# Altium schematic symbol library Altium_Lib.SchLib: 403 symbols (part 1 of 4) (continued)
## CONN_4_POS__S4B-ZR-SM4A-TF(LF)(SN) (continued)
CONN HEADER SMD R/A 4POS 1.5MM; Manufacturer: JST Sales America Inc.; Number of Positions: 4; Manufacturer Part Number: S4B-ZR-SM4A-TF(LF)(SN); Connector Type: Header; Mounting Type: All; Number of Rows: 1
footprint CONN_4_POS__S4B-ZR-SM4A-TF(LF)(SN)
pins: 1 (io), 2 (io), 3 (io), 4 (io)

## CONN_5_POS__22-05-7055
designator J?, comment 22-05-7055
CONN HEADER 5POS 2.5MM R/A TIN; Manufacturer: Molex Connector Corporation; Contact Length - Mating: 0.138" (3.50mm); Number of Positions: 5; Number of Positions Loaded: All; Pitch - Mating: 0.098" (2.50mm); Shrouding: Shrouded - 4 Wall; Category: Connectors, Interconnects; Connector Type: Header; Contact Finish - Mating: Tin; Contact Finish Thickness - Mating: 160µin (4.06µm); Contact Type: Male Pin; Fastening Type: Detent Lock; Features: -; Ingress Protection: -; Insulation Color: Natural; Manufacturer Part Number: 22-05-7055; Mounting Type: Through Hole, Right Angle; Number of Rows: 1; Packaging: Bulk; Part Status: Active; RoHS: RoHS Compliant; Row Spacing - Mating: -; Supplier: Digi-Key; Termination: Solder; ComponentLink1URL: http://www.molex.com/pdm_docs/sd/022057055_sd.pdf; ComponentLink1Description: http://www.molex.com/pdm_docs/sd/022057055_sd.pdf; Pricing: 1=0.81, 10=0.711, 50=0.6418, 100=0.6138, 250=0.558, 500=0.5022, 1000=0.4464, 2500=0.40455, 5000=0.3906 (USD); Supplier Part Number: WM18903-ND
footprint CONN_5_POS__22-05-7055 (2.50mm Wafer connector (molex))
pins: 1 (io), 2 (io), 3 (io), 4 (io), 5 (io)

## CONN_5_POS__0530470510
designator J?, comment 0530470510
CONN HEADER 5POS 1.25MM VERT TIN; Manufacturer: Molex, LLC; Number of Positions Loaded: All; Material Flammability Rating: UL94 V-0; Shrouding: Shrouded - 4 Wall; Style: Board to Cable/Wire; Number of Positions: 5; Pitch - Mating: 0.049" (1.25mm); Contact Length - Mating: 0.089" (2.25mm); Contact Length - Post: 0.091" (2.30mm); Current Rating: -; Manufacturer Part Number: 0530470510; Contact Finish Thickness - Post: -; Voltage Rating: -; Insulation Color: Natural; Insulation Material: Polyamide (PA66), Nylon 6/6; Category: Connectors, Interconnects; Supplier: Digi-Key; Ingress Protection: -; Number of Rows: 1; Contact Finish Thickness - Mating: 35.0µin (0.90µm); Termination: Solder; Contact Finish - Mating: Tin; Insulation Height: 0.165" (4.20mm); Contact Finish - Post: Tin; Contact Shape: Rectangular; Fastening Type: Detent Lock; Mated Stacking Heights: -; Packaging: Tray; Part Status: Active; Contact Material: Phosphor Bronze; RoHS: RoHS Compliant; Mounting Type: Through Hole; Connector Type: Header; Row Spacing - Mating: -; Features: -; Contact Type: Male Blade; Overall Contact Length: -; Operating Temperature: -; Applications: Automotive, General Purpose, Industrial, Medical; ComponentLink1URL: https://www.molex.com/pdm_docs/sd/530470510_sd.pdf; ComponentLink1Description: https://www.molex.com/pdm_docs/sd/530470510_sd.pdf; Pricing: 1=0.49, 10=0.463, 100=0.3551, 500=0.3088, 1000=0.25476, 5000=0.22388, 10000=0.20844 (USD); Supplier Part Number: WM1734-ND
footprint CONN_5_POS__0530470510
pins: 1 (io), 2 (io), 3 (io), 4 (io), 5 (io)

## CONN_5_POS__0530480510
designator J?, comment 0530480510
CONN HEADER 5POS 1.25MM R/A TIN; Manufacturer: Molex, LLC; Pitch - Mating: 0.049" (1.25mm); Shrouding: Shrouded - 4 Wall; Number of Positions: 5; Style: Board to Cable/Wire; Contact Length - Post: 0.091" (2.30mm); Number of Positions Loaded: All; Material Flammability Rating: UL94 V-0; Contact Material: Phosphor Bronze; Contact Length - Mating: -; Category: Connectors, Interconnects; Insulation Height: 0.138" (3.50mm); Fastening Type: Detent Lock; Part Status: Active; Packaging: Tray; Contact Shape: Rectangular; Contact Finish Thickness - Mating: -; Termination: Solder; Connector Type: Header; Mounting Type: Through Hole, Right Angle; Overall Contact Length: -; Contact Finish - Mating: Tin; Insulation Material: Polyamide (PA), Nylon; Features: -; Supplier: Digi-Key; Manufacturer Part Number: 0530480510; Contact Finish - Post: Tin; Number of Rows: 1; Row Spacing - Mating: -; Contact Type: Male Blade; RoHS: RoHS Compliant; Operating Temperature: -; Ingress Protection: -; Insulation Color: Natural; Current Rating: -; Voltage Rating: -; Mated Stacking Heights: -; Contact Finish Thickness - Post: -; Applications: Automotive, General Purpose, Industrial, Medical; ComponentLink1URL: http://www.molex.com/pdm_docs/sd/530480510_sd.pdf; ComponentLink1Description: http://www.molex.com/pdm_docs/sd/530480510_sd.pdf; Pricing: 1=0.55, 10=0.518, 25=0.4664, 50=0.4144, 100=0.3972, 250=0.36268, 500=0.3454, 1000=0.28496, 2500=0.25905 (USD); Supplier Part Number: WM1745-ND
footprint CONN_5_POS__0530480510
pins: 1 (io), 2 (io), 3 (io), 4 (io), 5 (io)

## CONN_5_POS__0532610571
designator J?, comment 53261-0571
Headers & Wire Housings R/A SMT 5POS HEADER; Manufacturer: Molex; Current Rating: 1 A; Mounting Angle: Right Angle; Number of Positions: 5 Position; Voltage Rating: 125 V; Pitch: 1.25 mm; Supplier 1: Mouser; Manufacturer Part Number: 53261-0571; RoHS: RoHS Compliant; Category: Headers & Wire Housings; Stock 1: 15425; Pricing 1: 1=0.780, 10=0.685, 100=0.596, 500=0.487, 1000=0.433, 2000=0.392, 5000=0.379, 10000=0.360, 25000=0.352 (USD); Accessory Type: -; Contact Plating: Tin; Contact Type: -; Housing Material: Thermoplastic; Number of Rows: 1 Row; Packaging: Cut Tape; Product: Headers; Series: 53261; Termination Style: SMD/SMT; Type: Shrouded; Brand: Molex; Contact Material: Tin; Flammability Rating: UL 94 V-0; Mounting Style: SMD; Row Spacing: -; Contact Gender: Pin (Male); Maximum Operating Temperature: + 85 C; Minimum Operating Temperature: - 40 C; Standard Pack Qty: 1000; Tradename: PicoBlade; RoHS - Mouser: Y; Minimum Order Quantity: 1; Reeling: True; ComponentLink1URL: https://www.mouser.com/datasheet/2/276/0532610571_PCB_HEADERS-170968.pdf; ComponentLink1Description: https://www.mouser.com/datasheet/2/276/0532610571_PCB_HEADERS-170968.pdf; Supplier Part Number 1: 538-53261-0571
footprint CONN_5_POS__0532610571
pins: 1 (io), 2 (io), 3 (io), 4 (io), 5 (io)

## CONN_5_POS__0533980571
designator J?, comment 53398-0571
CONN HEADER SMD 5POS 1.25MM; Manufacturer: Molex; Current Rating: 1 A; Mounting Angle: Vertical; Number of Positions: 5 Position; Voltage Rating: 125 V; Supplier 1: Mouser; Manufacturer Part Number: 53398-0571; RoHS: RoHS Compliant; Category: Headers & Wire Housings; Stock 1: 51775; Pricing 1: 1=1.32, 10=1.15, 100=0.999, 500=0.818, 1000=0.389, 2000=0.342, 10000=0.334, 25000=0.326 (USD); Accessory Type: -; Contact Plating: Tin; Contact Type: -; Housing Material: Nylon; Number of Rows: 1 Row; Packaging: Cut Tape; Product: Headers; Series: 53398; Termination Style: SMD/SMT; Type: Shrouded; Brand: Molex; Contact Material: Tin; Flammability Rating: UL 94 V-0; Mounting Style: SMD/SMT; Pitch: 1.25 mm; Row Spacing: -; Contact Gender: Pin (Male); Housing Color: Natural; Maximum Operating Temperature: + 105 C; Minimum Operating Temperature: - 40 C; Product Type: Headers & Wire Housings; Standard Pack Qty: 1000; Subcategory: Headers & Wire Housings; Tradename: PicoBlade; RoHS - Mouser: Y; Minimum Order Quantity: 1; Reeling: True; ComponentLink1URL: https://www.mouser.com/datasheet/2/276/0533980571_PCB_HEADERS-146486.pdf; ComponentLink1Description: https://www.mouser.com/datasheet/2/276/0533980571_PCB_HEADERS-146486.pdf; Supplier Part Number 1: 538-53398-0571
footprint CONN_5_POS__0533980571
pins: 1 (io), 2 (io), 3 (io), 4 (io), 5 (io)

## CONN_5_POS__0705530004
designator J?, comment 0705530004
CONN HEADER 5POS .100 R/A GOLD; Manufacturer: Molex, LLC; Material Flammability Rating: UL94 V-0; Pitch - Mating: 0.100" (2.54mm); Style: Board to Cable/Wire; Shrouding: Shrouded - 4 Wall; Contact Length - Post: 0.130" (3.30mm); Contact Length - Mating: 0.240" (6.10mm); Number of Positions: 5; Number of Positions Loaded: All; Voltage Rating: 250V; Connector Type: Header; Contact Material: Phosphor Bronze; Contact Finish - Post: Tin; Category: Connectors, Interconnects; Insulation Material: Polyester, Glass Filled; Ingress Protection: -; Insulation Height: 0.215" (5.45mm); Operating Temperature: -40°C ~ 105°C; Termination: Solder; Contact Finish Thickness - Mating: 15µin (0.38µm); Part Status: Active; Supplier: Digi-Key; Fastening Type: Latch Holder; Number of Rows: 1; Packaging: Tube; Contact Shape: Square; Manufacturer Part Number: 0705530004; Mounting Type: Through Hole, Right Angle; Overall Contact Length: -; Contact Type: Male Pin; Features: -; Contact Finish - Mating: Gold; Row Spacing - Mating: -; RoHS: RoHS Compliant; Contact Finish Thickness - Post: 74.8µin (1.90µm); Mated Stacking Heights: -; Applications: Automotive, General Purpose, Industrial, Medical; Insulation Color: Black; Current Rating: -; ComponentLink1URL: http://www.molex.com/pdm_docs/sd/705530002_sd.pdf; ComponentLink1Description: http://www.molex.com/pdm_docs/sd/705530002_sd.pdf; Pricing: 1=1.45, 10=1.32, 50=1.1854, 100=1.1315, 250=1.02372, 500=0.9429, 1000=0.8082, 2500=0.75432, 5000=0.7166 (USD); Supplier Part Number: WM4903-ND
footprint CONN_5_POS__705530004
pins: 1 (io), 2 (io), 3 (io), 4 (io), 5 (io)

## CONN_5_POS__5015680507
designator J?, comment 501568-0507
CONN HEADER SMD R/A 5POS 1MM; Manufacturer: Molex; Current Rating: 1 A; Mounting Angle: Right Angle; Number of Positions: 5 Position; Voltage Rating: 50 VAC/DC; Supplier 1: Mouser; Manufacturer Part Number: 501568-0507; RoHS: RoHS Compliant; Category: Headers & Wire Housings; Stock 1: 4935; Pricing 1: 1=0.670, 10=0.603, 100=0.475, 500=0.425, 1000=0.385, 1700=0.274, 8500=0.262, 23800=0.259 (USD); Accessory Type: -; Contact Plating: Tin; Contact Type: -; Housing Material: Nylon; Number of Rows: 1 Row; Packaging: Cut Tape; Product: Headers; Series: 501568; Termination Style: SMD/SMT; Type: Shrouded; Brand: Molex; Contact Material: Tin; Mounting Style: SMD/SMT; Pitch: 1 mm; Row Spacing: -; Contact Gender: Pin (Male); Maximum Operating Temperature: + 105 C; Minimum Operating Temperature: - 40 C; Product Type: Headers & Wire Housings; Standard Pack Qty: 1700; Subcategory: Headers & Wire Housings; Tradename: Pico-Clasp; RoHS - Mouser: Y; Minimum Order Quantity: 1; Reeling: True; ComponentLink1URL: https://www.mouser.com/datasheet/2/276/5015680507_PCB_HEADERS-179165.pdf; ComponentLink1Description: https://www.mouser.com/datasheet/2/276/5015680507_PCB_HEADERS-179165.pdf; Supplier Part Number 1: 538-501568-0507
footprint CONN_5_POS__5015680507
pins: 1 (io), 2 (io), 3 (io), 4 (io), 5 (io)

## CONN_5_POS__PAD
designator J?  (value not drawn)  (no BOM)
CONN HEADER 5POS PAD; Number of Positions Loaded: All; Number of Positions: 5; Manufacturer Part Number: *; Number of Rows: 1; Manufacturer: *
footprint CONN_5_POS__PAD
pins: 1 (io), 2 (io), 3 (io), 4 (io), 5 (io)

## CONN_6_POS__43045-0601
designator J?, comment 0430450601
CONN HEADER R/A DUAL GOLD 6CKT; Manufacturer: Molex, LLC; Number of Positions: 6; Number of Positions Loaded: All; Pitch - Mating: 0.118" (3.00mm); Shrouding: Shrouded - 4 Wall; Category: Connectors, Interconnects; Connector Type: Header; Contact Finish - Mating: Gold; Contact Finish Thickness - Mating: 15µin (0.38µm); Contact Length - Mating: -; Contact Type: Male Pin; Fastening Type: Locking Ramp; Features: Board Lock; Ingress Protection: -; Insulation Color: Black; Manufacturer Part Number: 0430450601; Mounting Type: Through Hole, Right Angle; Number of Rows: 2; Packaging: Tray; Part Status: Active; RoHS: RoHS Compliant; Row Spacing - Mating: 0.118" (3.00mm); Supplier: Digi-Key; Termination: Solder; ComponentLink1URL: http://www.molex.com/pdm_docs/sd/430450601_sd.pdf; ComponentLink1Description: http://www.molex.com/pdm_docs/sd/430450601_sd.pdf; Pricing: 1=2.14, 10=1.943, 50=1.7444, 100=1.6651, 250=1.50652, 500=1.38758, 1000=1.18935, 2500=1.11006, 5000=1.05456 (USD); Supplier Part Number: WM4037-ND
footprint CONN_6_POS__20430450601
pins: 1 (io), 2 (io), 3 (io), 4 (io), 5 (io), 6 (io)

## CONN_6_POS__0430450612
designator J?, comment 0430450612
CONN HEADER 6POS 3MM VERT TIN; Manufacturer: Molex, LLC; Pitch - Mating: 0.118" (3.00mm); Shrouding: Shrouded - 4 Wall; Number of Positions: 6; Style: Board to Cable/Wire; Number of Positions Loaded: All; Contact Length - Post: 0.125" (3.18mm); Material Flammability Rating: UL94 V-0; Ingress Protection: -; Connector Type: Header; Contact Finish - Mating: Tin; RoHS: RoHS Compliant; Contact Length - Mating: -; Part Status: Active; Current Rating: -; Contact Finish - Post: Tin; Contact Material: Brass; Row Spacing - Mating: 0.118" (3.00mm); Packaging: Tray; Operating Temperature: -; Overall Contact Length: -; Insulation Material: Liquid Crystal Polymer (LCP), Glass Filled; Termination: Kinked Pin, Solder; Features: Board Guide; Contact Shape: Square; Number of Rows: 2; Contact Finish Thickness - Mating: 100µin (2.54µm); Contact Type: Male Pin; Voltage Rating: -; Applications: General Purpose, Medical, Military, Telecommunications; Contact Finish Thickness - Post: -; Insulation Color: Black; Mated Stacking Heights: -; Fastening Type: Locking Ramp; Insulation Height: 0.390" (9.91mm); Manufacturer Part Number: 0430450612; Mounting Type: Through Hole; Category: Connectors, Interconnects; Supplier: Digi-Key; ComponentLink1URL: http://www.molex.com/pdm_docs/sd/430450612_sd.pdf; ComponentLink1Description: http://www.molex.com/pdm_docs/sd/430450612_sd.pdf; Pricing: 1=1.36, 10=1.232, 50=1.106, 100=1.0557, 250=0.95512, 500=0.87972, 1000=0.75405, 2500=0.70378, 5000=0.66859 (USD); Supplier Part Number: WM1791-ND
footprint CONN_6_POS__0430450612
pins: 1 (io), 2 (io), 3 (io), 4 (io), 5 (io), 6 (io)

## CONN_6_POS__0530470610
designator J?, comment 0530470610
CONN HEADER 6POS 1.25MM VERT TIN; Manufacturer: Molex, LLC; Pitch - Mating: 0.049" (1.25mm); Shrouding: Shrouded - 4 Wall; Material Flammability Rating: UL94 V-0; Contact Length - Post: 0.091" (2.30mm); Number of Positions: 6; Style: Board to Cable/Wire; Number of Positions Loaded: All; Contact Length - Mating: 0.089" (2.25mm); Manufacturer Part Number: 0530470610; Category: Connectors, Interconnects; Supplier: Digi-Key; RoHS: RoHS Compliant; Contact Finish - Mating: Tin; Mated Stacking Heights: -; Applications: Automotive, General Purpose, Industrial, Medical; Contact Shape: Rectangular; Insulation Height: 0.165" (4.20mm); Mounting Type: Through Hole; Contact Material: Phosphor Bronze; Ingress Protection: -; Current Rating: -; Features: -; Contact Type: Male Blade; Operating Temperature: -; Connector Type: Header; Part Status: Active; Packaging: Tray; Overall Contact Length: -; Row Spacing - Mating: -; Number of Rows: 1; Contact Finish - Post: Tin; Contact Finish Thickness - Mating: 35.4µin (0.90µm); Insulation Material: Polyamide (PA66), Nylon 6/6; Voltage Rating: -; Contact Finish Thickness - Post: -; Insulation Color: Natural; Fastening Type: Detent Lock; Termination: Solder; ComponentLink1URL: https://www.molex.com/pdm_docs/sd/530470610_sd.pdf; ComponentLink1Description: https://www.molex.com/pdm_docs/sd/530470610_sd.pdf; Pricing: 1=0.62, 10=0.585, 100=0.4487, 500=0.3902, 1000=0.32192, 5000=0.2829, 10000=0.26339 (USD); Supplier Part Number: WM1735-ND
footprint CONN_6_POS__0530470610
pins: 1 (io), 2 (io), 3 (io), 4 (io), 5 (io), 6 (io)

## CONN_6_POS__0530480610
designator J?, comment 0530480610
CONN HEADER 6POS 1.25MM R/A TIN; Manufacturer: Molex, LLC; Number of Positions Loaded: All; Pitch - Mating: 0.049" (1.25mm); Number of Positions: 6; Style: Board to Cable/Wire; Shrouding: Shrouded - 4 Wall; Material Flammability Rating: UL94 V-0; Contact Length - Post: 0.091" (2.30mm); Supplier: Digi-Key; Category: Connectors, Interconnects; Mounting Type: Through Hole, Right Angle; Number of Rows: 1; Packaging: Tray; RoHS: RoHS Compliant; Part Status: Active; Manufacturer Part Number: 0530480610; Connector Type: Header; Contact Type: Male Blade; Row Spacing - Mating: -; Current Rating: -; Insulation Color: Natural; Contact Finish - Post: Tin; Contact Length - Mating: -; Contact Finish - Mating: Tin; Voltage Rating: -; Contact Finish Thickness - Post: -; Mated Stacking Heights: -; Fastening Type: Detent Lock; Operating Temperature: -; Contact Finish Thickness - Mating: -; Overall Contact Length: -; Insulation Material: Polyamide (PA), Nylon; Contact Material: Phosphor Bronze; Applications: Automotive, General Purpose, Industrial, Medical; Ingress Protection: -; Insulation Height: 0.138" (3.50mm); Termination: Solder; Features: -; Contact Shape: Rectangular; ComponentLink1URL: http://www.molex.com/pdm_docs/sd/530480610_sd.pdf; ComponentLink1Description: http://www.molex.com/pdm_docs/sd/530480610_sd.pdf; Pricing: 1=0.79, 10=0.744, 25=0.6692, 50=0.595, 100=0.5702, 250=0.5206, 500=0.4958, 1000=0.40904, 2500=0.37185 (USD); Supplier Part Number: WM1746-ND
footprint CONN_6_POS__0530480610
pins: 1 (io), 2 (io), 3 (io), 4 (io), 5 (io), 6 (io)

## CONN_6_POS__0559350630
designator J?, comment 55935-0630
Headers & Wire Housings 2.0 WtB Plg Hsg Assy Plg Hsg Assy RA 6Ckt; Manufacturer: Molex; Current Rating: 3 A; Mounting Angle: Right Angle; Pitch: 2 mm; Number of Positions: 6 Position; Voltage Rating: 250 V; RoHS: RoHS Compliant; Product: Headers; Manufacturer Part Number: 55935-0630; Series: 55935; Number of Rows: 1 Row; Contact Type: -; Category: Headers & Wire Housings; Accessory Type: -; Packaging: Tray; Contact Plating: Tin; Supplier: Mouser; Minimum Operating Temperature: - 25 C; Housing Material: Polyester; Product Type: Headers & Wire Housings; Mounting Style: Through Hole; Maximum Operating Temperature: + 85 C; Type: Shrouded; Contact Gender: Pin (Male); RoHS - Mouser: Y; Minimum Order Quantity: 1; Subcategory: Headers & Wire Housings; Contact Material: Tin; Reeling: False; Tradename: MicroClasp; Standard Pack Qty: 200; Housing Gender: -; Row Spacing: -; Brand: Molex; Termination Style: Through Hole; ComponentLink1URL: https://www.mouser.com/datasheet/2/276/0559350630_PCB_HEADERS-171317.pdf; ComponentLink1Description: https://www.mouser.com/datasheet/2/276/0559350630_PCB_HEADERS-171317.pdf; Pricing: 1=0.630, 10=0.543, 100=0.444, 500=0.357, 1000=0.295, 2500=0.268, 5000=0.259, 10000=0.241, 25000=0.232 (USD); Supplier Part Number: 538-55935-0630
footprint CONN_6_POS__0559350630
pins: 1 (io), 2 (io), 3 (io), 4 (io), 5 (io), 6 (io)

## CONN_6_POS__5015680607
designator J?, comment 501568-0607
Headers & Wire Housings 1.0 WtB 6Ckt R/AWaferAssyEmbsTpPk; Manufacturer: Molex; Current Rating: 1 A; Mounting Angle: Right Angle; Number of Positions: 6 Position; Voltage Rating: 50 VAC/DC; Pitch: 1 mm; Supplier 1: Mouser; Manufacturer Part Number: 501568-0607; RoHS: RoHS Compliant; Category: Headers & Wire Housings; Stock 1: 22880; Pricing 1: 1=0.770, 10=0.636, 100=0.557, 500=0.482, 1300=0.398, 2600=0.362, 3900=0.349, 9100=0.325, 24700=0.313 (USD); Accessory Type: -; Contact Plating: Tin; Contact Type: -; Housing Material: Nylon; Number of Rows: 1 Row; Packaging: Cut Tape; Product: Headers; Series: 501568; Termination Style: SMD/SMT; Type: Shrouded; Brand: Molex; Contact Material: Tin; Mounting Style: SMD; Row Spacing: -; Contact Gender: Pin (Male); Maximum Operating Temperature: + 105 C; Minimum Operating Temperature: - 40 C; Standard Pack Qty: 1300; Tradename: Pico-Clasp; RoHS - Mouser: Y; Minimum Order Quantity: 1; Reeling: True; ComponentLink1URL: https://www.mouser.com/datasheet/2/276/5015680607_PCB_HEADERS-155422.pdf; ComponentLink1Description: https://www.mouser.com/datasheet/2/276/5015680607_PCB_HEADERS-155422.pdf; Supplier Part Number 1: 538-501568-0607
footprint CONN_6_POS__5015680607
pins: 1 (io), 2 (io), 3 (io), 4 (io), 5 (io), 6 (io)

## CONN_6_POS__TBP02R1-381-06BE
designator J?, comment TBP02R1-381-06BE
TERMINAL BLOCK, PLUGGABLE, 3.81,; Manufacturer: CUI Devices; Product Status: New Product; Supplier 1: Mouser; Manufacturer Part Number: TBP02R1-381-06BE; RoHS: RoHS Compliant; Category: Pluggable Terminal Blocks; Stock 1: 0; Pricing 1: 1=0.00 (AUD); Minimum Order Quantity: 1; Reeling: False
footprint CONN_6_POS__TBP02R1-381-06BE (Connector; Header; 6 Position)
pins: 1 (io), 2 (io), 3 (io), 4 (io), 5 (io), 6 (io)

## CONN_7_POS__0530470710
designator J?, comment 0530470710
CONN HEADER 7POS 1.25MM VERT TIN; Manufacturer: Molex, LLC; Pitch - Mating: 0.049" (1.25mm); Number of Positions: 7; Number of Positions Loaded: All; Style: Board to Cable/Wire; Shrouding: Shrouded - 4 Wall; Contact Length - Mating: 0.089" (2.25mm); Contact Length - Post: 0.091" (2.30mm); Material Flammability Rating: UL94 V-0; Manufacturer Part Number: 0530470710; Category: Connectors, Interconnects; Supplier: Digi-Key; RoHS: RoHS Compliant; Packaging: Tray; Part Status: Active; Connector Type: Header; Contact Type: Male Blade; Number of Rows: 1; Row Spacing - Mating: -; Mounting Type: Through Hole; Termination: Solder; Fastening Type: Detent Lock; Overall Contact Length: -; Insulation Height: 0.165" (4.20mm); Contact Shape: Rectangular; Contact Finish - Mating: Tin; Contact Finish Thickness - Mating: 35µin (0.90µm); Contact Finish - Post: Tin; Contact Material: Phosphor Bronze; Insulation Material: Polyamide (PA66), Nylon 6/6; Features: -; Operating Temperature: -; Ingress Protection: -; Insulation Color: Natural; Current Rating: -; Voltage Rating: -; Mated Stacking Heights: -; Contact Finish Thickness - Post: -; Applications: Automotive, General Purpose, Industrial, Medical; ComponentLink1URL: http://www.molex.com/pdm_docs/sd/530470710_sd.pdf; ComponentLink1Description: http://www.molex.com/pdm_docs/sd/530470710_sd.pdf; Pricing: 1=0.67, 10=0.628, 100=0.4814, 500=0.4186, 1000=0.34535, 5000=0.30349, 10000=0.28256 (USD); Supplier Part Number: WM1736-ND
footprint CONN_7_POS__0530470710
pins: 1 (io), 2 (io), 3 (io), 4 (io), 5 (io), 6 (io), 7 (io)

## CONN_7_POS__0530480710
designator J?, comment 0530480710
CONN HEADER 7POS 1.25MM R/A TIN; Manufacturer: Molex, LLC; Pitch - Mating: 0.049" (1.25mm); Number of Positions: 7; Shrouding: Shrouded - 4 Wall; Style: Board to Cable/Wire; Number of Positions Loaded: All; Material Flammability Rating: UL94 V-0; Contact Length - Post: 0.091" (2.30mm); Supplier 1: Digi-Key; Category: Connectors, Interconnects; Supplier: Digi-Key; Packaging: Tray; Manufacturer Part Number: 0530480710; RoHS: RoHS Compliant; Part Status: Active; Contact Type: Male Blade; Connector Type: Header; Number of Rows: 1; Overall Contact Length: -; Insulation Color: Natural; Insulation Height: 0.138" (3.50mm); Features: -; Applications: Automotive, General Purpose, Industrial, Medical; Current Rating: -; Ingress Protection: -; Voltage Rating: -; Contact Finish Thickness - Mating: -; Row Spacing - Mating: -; Contact Finish - Mating: Tin; Fastening Type: Detent Lock; Insulation Material: Polyamide (PA), Nylon; Contact Finish Thickness - Post: -; Termination: Solder; Contact Shape: Rectangular; Operating Temperature: -; Mounting Type: Through Hole, Right Angle; Contact Length - Mating: -; Mated Stacking Heights: -; Contact Material: Phosphor Bronze; Contact Finish - Post: Tin; Supplier Part Number: WM1747-ND
footprint CONN_7_POS__0530480710
pins: 1 (io), 2 (io), 3 (io), 4 (io), 5 (io), 6 (io), 7 (io)

## CONN_7_POS__0532610771
designator J?, comment 53261-0771
CONN HEADER SMD R/A 7POS 1.25MM; Manufacturer: Molex; Current Rating: 1 A; Mounting Angle: Right Angle; Number of Positions: 7 Position; Voltage Rating: 125 V; Supplier 1: Mouser; Manufacturer Part Number: 53261-0771; RoHS: RoHS Compliant; Category: Headers & Wire Housings; Stock 1: 3729; Pricing 1: 1=1.25, 10=1.09, 100=0.940, 500=0.798, 1000=0.408, 2000=0.358, 10000=0.329, 25000=0.321 (USD); Accessory Type: -; Contact Plating: Tin; Contact Type: -; Housing Material: Thermoplastic; Number of Rows: 1 Row; Packaging: Cut Tape; Product: Headers; Series: 53261; Termination Style: SMD/SMT; Type: Shrouded; Brand: Molex; Contact Material: Tin; Flammability Rating: UL 94 V-0; Mounting Style: SMD/SMT; Pitch: 1.25 mm; Row Spacing: -; Contact Gender: Pin (Male); Housing Color: Natural; Maximum Operating Temperature: + 105 C; Minimum Operating Temperature: - 40 C; Product Type: Headers & Wire Housings; Standard Pack Qty: 1000; Subcategory: Headers & Wire Housings; Tradename: PicoBlade; RoHS - Mouser: Y; Minimum Order Quantity: 1; Reeling: True; ComponentLink1URL: https://www.mouser.com/datasheet/2/276/0532610771_PCB_HEADERS-170969.pdf; ComponentLink1Description: https://www.mouser.com/datasheet/2/276/0532610771_PCB_HEADERS-170969.pdf; Supplier Part Number 1: 538-53261-0771
footprint CONN_7_POS__0532610771
pins: 1 (io), 2 (io), 3 (io), 4 (io), 5 (io), 6 (io), 7 (io)

## CONN_7_POS__5015680707
designator J?, comment 501568-0707
CONN HEADER SMD R/A 7POS 1MM; Manufacturer: Molex; Current Rating: 1 A; Mounting Angle: Right Angle; Number of Positions: 7 Position; Voltage Rating: 50 VAC/DC; Supplier 1: Mouser; Manufacturer Part Number: 501568-0707; RoHS: RoHS Compliant; Category: Headers & Wire Housings; Stock 1: 2879; Pricing 1: 1=0.780, 10=0.639, 100=0.560, 500=0.484, 1300=0.400, 2600=0.363, 3900=0.351, 9100=0.327, 24700=0.315 (USD); Accessory Type: -; Contact Plating: Tin; Contact Type: -; Housing Material: Nylon; Number of Rows: 1 Row; Packaging: Cut Tape; Product: Headers; Series: 501568; Termination Style: SMD/SMT; Type: Shrouded; Brand: Molex; Contact Material: Tin; Mounting Style: SMD/SMT; Pitch: 1 mm; Row Spacing: -; Contact Gender: Pin (Male); Housing Color: Natural; Maximum Operating Temperature: + 105 C; Minimum Operating Temperature: - 40 C; Product Type: Headers & Wire Housings; Standard Pack Qty: 1300; Subcategory: Headers & Wire Housings; Tradename: Pico-Clasp; RoHS - Mouser: Y; Minimum Order Quantity: 1; Reeling: True; ComponentLink1URL: https://www.mouser.com/datasheet/2/276/5015680707_PCB_HEADERS-179190.pdf; ComponentLink1Description: https://www.mouser.com/datasheet/2/276/5015680707_PCB_HEADERS-179190.pdf; Supplier Part Number 1: 538-501568-0707
footprint CONN_7_POS__5015680707
pins: 1 (io), 2 (io), 3 (io), 4 (io), 5 (io), 6 (io), 7 (io)

## CONN_7_POS__PAD_(7X 1.25mmx3.5mm)
designator C?, comment CONN PAD 7 POS
CONN HEADER 7POS Solder pad; Manufacturer: *; Manufacturer Part Number: *; Mounting Type: SMT
footprint CONN_7_POS__PAD(7X 1.25mmx3.5mm)
pins: 1 (io), 2 (io), 3 (io), 4 (io), 5 (io), 6 (io), 7 (io)

## CONN_8_POS__0430450800
designator J?, comment 43045-0800
CONN HEADER R/A 8POS 3MM; Manufacturer: Molex; Current Rating: 8.5 A; Mounting Angle: Right Angle; Number of Positions: 8 Position; Voltage Rating: 600 V; Supplier 1: Mouser; Manufacturer Part Number: 43045-0800; RoHS: RoHS Compliant; Category: Headers & Wire Housings; Stock 1: 6379; Pricing 1: 1=1.90, 10=1.55, 100=1.34, 500=1.23, 1000=1.05, 2500=0.989, 5000=0.918, 10000=0.883 (USD); Accessory Type: -; Contact Plating: Tin; Contact Type: -; Housing Material: Thermoplastic; Number of Rows: 2 Row; Packaging: Tray; Product: Headers; Series: 43045; Termination Style: Through Hole; Type: Power; Brand: Molex; Contact Material: Tin; Flammability Rating: UL 94 V-0; Mounting Style: Board Lock; Pitch: 3 mm; Row Spacing: 3 mm; Contact Gender: Pin (Male); Housing Color: Black; Maximum Operating Temperature: + 105 C; Minimum Operating Temperature: - 40 C; Product Type: Headers & Wire Housings; Standard Pack Qty: 1440; Subcategory: Headers & Wire Housings; Tradename: Micro-Fit 3.0; RoHS - Mouser: Y; Minimum Order Quantity: 1; Reeling: False; ComponentLink1URL: https://www.mouser.com/datasheet/2/276/0430450800_PCB_HEADERS-142625.pdf; ComponentLink1Description: https://www.mouser.com/datasheet/2/276/0430450800_PCB_HEADERS-142625.pdf; Supplier Part Number 1: 538-43045-0800
footprint CONN_8_POS__0430450800
pins: 1 (io), 2 (io), 3 (io), 4 (io), 5 (io), 6 (io), 7 (io), 8 (io)

## CONN_8_POS__0430450812
designator J?, comment 0430450812
CONN HEADER 8POS 3MM VERT TIN; Manufacturer: Molex, LLC; Material Flammability Rating: UL94 V-0; Contact Length - Post: 0.125" (3.18mm); Shrouding: Shrouded - 4 Wall; Style: Board to Cable/Wire; Number of Positions Loaded: All; Number of Positions: 8; Pitch - Mating: 0.118" (3.00mm); Current Rating: -; Insulation Height: 0.390" (9.91mm); Voltage Rating: -; Contact Length - Mating: -; Features: Board Guide; Contact Finish - Post: Tin; Fastening Type: Locking Ramp; Contact Finish - Mating: Tin; Insulation Material: Liquid Crystal Polymer (LCP), Glass Filled; Contact Material: Brass; Overall Contact Length: -; Contact Shape: Square; Ingress Protection: -; Termination: Kinked Pin, Solder; Contact Finish Thickness - Mating: 100µin (2.54µm); Operating Temperature: -; Mated Stacking Heights: -; Insulation Color: Black; Contact Finish Thickness - Post: -; Applications: General Purpose, Medical, Military, Telecommunications; Contact Type: Male Pin; Manufacturer Part Number: 0430450812; Part Status: Active; Category: Connectors, Interconnects; Packaging: Tray; Supplier: Digi-Key; RoHS: RoHS Compliant; Mounting Type: Through Hole; Connector Type: Header; Number of Rows: 2; Row Spacing - Mating: 0.118" (3.00mm); ComponentLink1URL: http://www.molex.com/pdm_docs/sd/430450812_sd.pdf; ComponentLink1Description: http://www.molex.com/pdm_docs/sd/430450812_sd.pdf; Pricing: 1=1.73, 10=1.566, 50=1.4064, 100=1.3425, 250=1.21468, 500=1.11878, 1000=0.95895, 2500=0.89502, 5000=0.85027 (USD); Supplier Part Number: WM1792-ND
footprint CONN_8_POS__0430450812
pins: 1 (io), 2 (io), 3 (io), 4 (io), 5 (io), 6 (io), 7 (io), 8 (io)

## CONN_12_POS__0430451200
designator J?, comment 43045-1200
CONN HEADER R/A 12POS 3MM; Manufacturer: Molex; Current Rating: 8.5 A; Mounting Angle: Right Angle; Number of Positions: 12 Position; Voltage Rating: 600 V; Supplier 1: Mouser; Manufacturer Part Number: 43045-1200; RoHS: RoHS Compliant; Category: Headers & Wire Housings; Stock 1: 1509; Pricing 1: 1=2.74, 10=2.63, 25=2.53, 100=2.19, 250=1.92, 500=1.86, 1000=1.59, 2500=1.48, 5000=1.43 (USD); Accessory Type: -; Contact Plating: Tin; Contact Type: -; Housing Material: Thermoplastic; Number of Rows: 2 Row; Packaging: Tray; Product: Headers; Series: 43045; Termination Style: Through Hole; Type: Power; Brand: Molex; Contact Material: Tin; Flammability Rating: UL 94 V-0; Mounting Style: Board Lock; Pitch: 3 mm; Row Spacing: 3 mm; Contact Gender: Pin (Male); Housing Color: Black; Maximum Operating Temperature: + 105 C; Minimum Operating Temperature: - 40 C; Product Type: Headers & Wire Housings; Standard Pack Qty: 1008; Subcategory: Headers & Wire Housings; Tradename: Micro-Fit 3.0; RoHS - Mouser: Y; Minimum Order Quantity: 1; Reeling: False; ComponentLink1URL: https://www.mouser.com/datasheet/2/276/0430451200_PCB_HEADERS-228589.pdf; ComponentLink1Description: https://www.mouser.com/datasheet/2/276/0430451200_PCB_HEADERS-228589.pdf; Supplier Part Number 1: 538-43045-1200
footprint CONN_12_POS__0430451200
pins: 1 (io), 2 (io), 3 (io), 4 (io), 5 (io), 6 (io), 7 (io), 8 (io), 9 (io), 10 (io), 11 (io), 12 (io)

## CONN_12_POS__0430451212
designator J?, comment 43045-1212
CONN HEADER VERT 12POS 3MM; Manufacturer: Molex; Current Rating: 8.5 A; Mounting Angle: Vertical; Number of Positions: 12 Position; Voltage Rating: 600 V; Supplier 1: Mouser; Manufacturer Part Number: 43045-1212; RoHS: RoHS Compliant; Category: Headers & Wire Housings; Stock 1: 1400; Pricing 1: 1=2.16, 10=2.01, 100=1.81, 500=1.55, 1000=1.32, 2500=1.30, 5000=1.19, 10000=1.16 (USD); Accessory Type: -; Contact Plating: Tin; Contact Type: -; Housing Material: Thermoplastic (TP); Number of Rows: 2 Row; Packaging: Tray; Product: Headers; Series: 43045; Termination Style: Through Hole; Type: Power; Brand: Molex; Contact Material: Tin; Flammability Rating: UL 94 V-0; Mounting Style: Kinked Pin; Pitch: 3 mm; Row Spacing: 3 mm; Contact Gender: Pin (Male); Housing Color: Black; Maximum Operating Temperature: + 105 C; Minimum Operating Temperature: - 40 C; Product Type: Headers & Wire Housings; Standard Pack Qty: 1008; Subcategory: Headers & Wire Housings; Tradename: Micro-Fit 3.0; RoHS - Mouser: Y; Minimum Order Quantity: 1; Reeling: False; ComponentLink1URL: https://www.mouser.com/datasheet/2/276/0430451212_PCB_HEADERS-168208.pdf; ComponentLink1Description: https://www.mouser.com/datasheet/2/276/0430451212_PCB_HEADERS-168208.pdf; Supplier Part Number 1: 538-43045-1212
footprint CONN_12_POS__0430451212
pins: 1 (io), 2 (io), 3 (io), 4 (io), 5 (io), 6 (io), 7 (io), 8 (io), 9 (io), 10 (io), 11 (io), 12 (io)

## CONN_20_POS__6-534206-0
designator J?, comment 6-534206-0
CONN RECEPT 20POS .100 VERT DUAL; Manufacturer: TE Connectivity AMP Connectors; Current Rating: 2A; Connector Type: Receptacle; Style: Board to Board or Cable; Number of Positions: 20; Number of Positions Loaded: All; Pitch - Mating: 0.100" (2.54mm); Contact Length - Post: 0.115" (2.92mm); Material Flammability Rating: UL94 V-0; Ingress Protection: -; Features: -; Voltage Rating: -; Applications: -; Insulation Material: Polyester, Glass Filled; Contact Shape: Square; Contact Material: Phosphor Bronze; Contact Finish Thickness - Post: 150µin (3.81µm); Manufacturer Part Number: 6-534206-0; Category: Connectors, Interconnects; Supplier: Digi-Key; RoHS: RoHS Compliant; Packaging: Tube; Part Status: Active; Contact Type: Female Socket; Number of Rows: 2; Row Spacing - Mating: 0.100" (2.54mm); Mounting Type: Through Hole; Termination: Solder; Fastening Type: Push-Pull; Contact Finish - Mating: Gold; Contact Finish Thickness - Mating: 30µin (0.76µm); Insulation Color: Black; Insulation Height: 0.320" (8.13mm); Operating Temperature: -65°C ~ 125°C; Contact Finish - Post: Tin; Mated Stacking Heights: -; ComponentLink1URL: http://www.te.com/commerce/DocumentDelivery/DDEController?Action=srchrtrv&DocNm=534206&DocType=Customer+Drawing&DocLang=English; ComponentLink1Description: http://www.te.com/commerce/DocumentDelivery/DDEController?Action=srchrtrv&DocNm=534206&DocType=Customer+Drawing&DocLang=English; Pricing: 1=4.25, 10=4.08, 50=3.57, 100=3.4, 250=2.975, 500=2.89, 1000=2.465, 2500=2.295 (USD); Supplier Part Number: A32941-ND
footprint CONN_20_POS__6-534206-0
pins: 1 (io), 2 (io), 3 (io), 4 (io), 5 (io), 6 (io), 7 (io), 8 (io), 9 (io), 10 (io), 11 (io), 12 (io), 13 (io), 14 (io), 15 (io), 16 (io), 17 (io), 18 (io), 19 (io), 20 (io)

## CONN_40_POS__AXK5F40347YG
designator J?, comment AXK5F40347YG
CONN SOCKET P5KF .5MM 40POS SMD; Manufacturer: Panasonic Electric Works; Mated Stacking Heights: 1.5mm; Connector Type: Socket, Outer Shroud Contacts; Pitch: 0.020" (0.50mm); Number of Positions: 40; Mounting Type: Surface Mount; Category: Connectors, Interconnects; RoHS: RoHS Compliant; Part Status: Active; Packaging: Tape & Reel (TR); Height Above Board: 0.053" (1.35mm); Features: -; Contact Finish Thickness: -; Number of Rows: 2; Supplier: Digi-Key; Manufacturer Part Number: AXK5F40347YG; Contact Finish: Gold; ComponentLink1URL: http://www3.panasonic.biz/ac/e_download/control/connector/base-fpc/catalog/con_eng_p5kf.pdf; ComponentLink1Description: http://www3.panasonic.biz/ac/e_download/control/connector/base-fpc/catalog/con_eng_p5kf.pdf; Pricing: 2000=1.276, 4000=1.232, 6000=1.1704 (USD); Supplier Part Number: 255-2566-2-ND
footprint CONN_40_POS__AXK5F40347YG
pins: 1 (io), 2 (io), 3 (io), 4 (io), 5 (io), 6 (io), 7 (io), 8 (io), 9 (io), 10 (io), 11 (io), 12 (io), 13 (io), 14 (io), 15 (io), 16 (io), 17 (io), 18 (io), 19 (io), 20 (io), 21 (io), 22 (io), 23 (io), 24 (io), 25 (io), 26 (io), 27 (io), 28 (io), 29 (io), 30 (io), 31 (io), 32 (io), 33 (io), 34 (io), 35 (io), 36 (io), 37 (io), 38 (io), 39 (io), 40 (io)

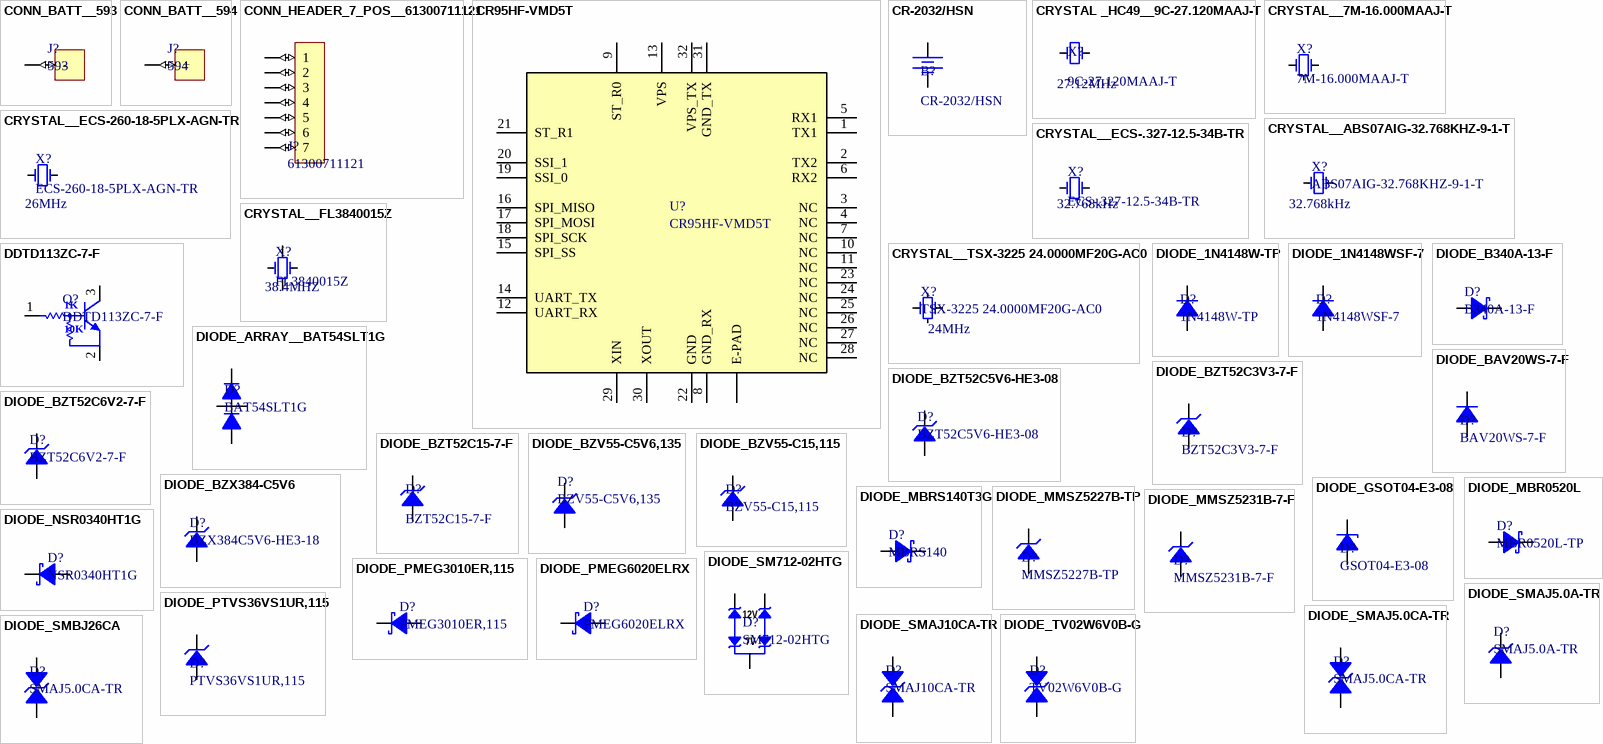
[diagram p3: symbols CONN_BATT__593 to DIODE_TV02W6V0B-G]

## CONN_BATT__593
designator J?, comment 593
CONN BATT MALE 9V HORZ SNAP-ON; Manufacturer: Keystone Electronics; Style: Contact Snap (Negative); Battery Type, Function: 9V, Snap Contact (Single); Supplier 1: Digi-Key; Operating Temperature: -; Height Above Board: 0.550" (13.97mm); Battery Series: -; Number of Cells: -; Termination Style: PC Pin; Mounting Type: PCB, Through Hole; Battery Cell Size: 9V; Part Status: Active; RoHS: RoHS Compliant; Manufacturer Part Number: 593; Supplier: Digi-Key; Category: Battery Products; ComponentLink1URL: http://www.keyelco.com/product-pdf.cfm?p=1123; ComponentLink1Description: http://www.keyelco.com/product-pdf.cfm?p=1123; Pricing: 1=0.43, 10=0.405, 50=0.3242, 100=0.3106, 250=0.2836, 500=0.275, 1000=0.242, 2500=0.2026, 5000=0.19582 (USD); Supplier Part Number: 36-593-ND
footprint CONN_BATT_593
pins: 1 - (io)

## CONN_BATT__594
designator J?, comment 594
CONN BATT FEM 9V HORZ SNAP-ON; Manufacturer: Keystone Electronics; Battery Type, Function: 9V, Snap Contact (Single); Style: Contact Snap (Positive); Supplier 1: Digi-Key; Manufacturer Part Number: 594; Category: Battery Products; Supplier: Digi-Key; RoHS: RoHS Compliant; Part Status: Active; Battery Cell Size: 9V; Number of Cells: -; Battery Series: -; Mounting Type: PCB, Through Hole; Termination Style: PC Pin; Height Above Board: 0.550" (13.97mm); Operating Temperature: -; ComponentLink1URL: http://www.keyelco.com/product-pdf.cfm?p=1124; ComponentLink1Description: http://www.keyelco.com/product-pdf.cfm?p=1124; Pricing: 1=0.5, 10=0.473, 50=0.3782, 100=0.3624, 250=0.33084, 500=0.3205, 1000=0.28225, 2500=0.23635, 5000=0.22845 (USD); Supplier Part Number: 36-594-ND
footprint CONN_BATT_594
pins: 1 + (io)

## CONN_HEADER_7_POS__61300711121
designator J?, comment 61300711121
CONN HEADER 7 POS 2.54; Manufacturer: Wurth Electronics Inc.; Contact Length - Post: 0.118" (3.00mm); Overall Contact Length: 0.454" (11.54mm); Number of Positions: 7; Number of Positions Loaded: All; Shrouding: Unshrouded; Style: Board to Board or Cable; Pitch - Mating: 0.100" (2.54mm); Contact Length - Mating: 0.236" (6.00mm); Material Flammability Rating: UL94 V-0; Current Rating: 3A; Voltage Rating: 250V; Mounting Type: Through Hole; Insulation Height: 0.100" (2.54mm); Row Spacing - Mating: -; Supplier: Digi-Key; Fastening Type: Push-Pull; Termination: Solder; Contact Finish - Mating: Gold; Contact Shape: Square; Contact Type: Male Pin; Packaging: Bulk; Part Status: Active; Category: Connectors, Interconnects; Number of Rows: 1; Connector Type: Header; RoHS: RoHS Compliant; Manufacturer Part Number: 61300711121; Contact Finish Thickness - Mating: -; Contact Finish - Post: -; Contact Material: Copper Alloy; Insulation Material: Polybutylene Terephthalate (PBT); Features: -; Operating Temperature: -40°C ~ 125°C; Ingress Protection: -; Insulation Color: Black; Mated Stacking Heights: -; Contact Finish Thickness - Post: -; Applications: -; ComponentLink1URL: http://katalog.we-online.de/em/datasheet/6130xx11121.pdf; ComponentLink1Description: http://katalog.we-online.de/em/datasheet/6130xx11121.pdf; Pricing: 1=0.37, 10=0.315, 25=0.2632, 50=0.219, 100=0.199, 1000=0.181 (USD); Supplier Part Number: 732-5320-ND
footprint CONN_HEADER_7_POS__61300711121
pins: 1 (io), 2 (io), 3 (io), 4 (io), 5 (io), 6 (io), 7 (io)

## CR95HF-VMD5T
designator U?
TRANSCEIVER 13.56MHZ 32-VFQFPN; Manufacturer: STMicroelectronics; Standards: ISO 14443, ISO 15693, 18000-3, MIFARE, NFC; Voltage - Supply: 2.7 V ~ 5.5 V; Interface: SPI, UART; Supplier Device Package: 32-VFQFPN (5x5); Package / Case: 32-VFQFN Exposed Pad; RoHS: RoHS Compliant; Type: RFID Reader/Transponder; Packaging: Tape & Reel (TR); Manufacturer Part Number: CR95HF-VMD5T; Part Status: Active; Frequency: 13.56MHz; Category: RF/IF and RFID; Supplier: Digi-Key; Operating Temperature: -25°C ~ 85°C; ComponentLink1URL: http://www.st.com/content/ccc/resource/technical/document/datasheet/d2/cc/cb/f6/7c/63/48/75/DM00025644.pdf/files/DM00025644.pdf/jcr:content/translations/en.DM00025644.pdf; ComponentLink1Description: http://www.st.com/content/ccc/resource/technical/document/datasheet/d2/cc/cb/f6/7c/63/48/75/DM00025644.pdf/files/DM00025644.pdf/jcr:content/translations/en.DM00025644.pdf; Pricing: 3000=2.261 (USD); Supplier Part Number: 497-15737-2-ND
footprint VFQFN-32_Exposed_Pad(5mmx5mm)
pins: 0 E-PAD, 1 TX1, 2 TX2, 3 NC, 4 NC, 5 RX1, 6 RX2, 7 NC, 8 GND_RX, 9 ST_R0, 10 NC, 11 NC, 12 UART_RX, 13 VPS, 14 UART_TX, 15 SPI_SS, 16 SPI_MISO, 17 SPI_MOSI, 18 SPI_SCK, 19 SSI_0, 20 SSI_1, 21 ST_R1, 22 GND, 23 NC, 24 NC, 25 NC, 26 NC, 27 NC, 28 NC, 29 XIN, 30 XOUT, 31 GND_TX, 32 VPS_TX

## CR-2032/HSN
designator B?
BATTERY LITHIUM 3V COIN 20MM; Manufacturer: PANASONIC BATTERIES; Chemistry: LithiumMetal; RatedVoltage: 3|; Capacity: 0.225|; Rechargeable: No; Supplier 1: Future Electronics; Manufacturer Part Number: CR-2032/HSN; RoHS: Y; Category: Batteries; Stock 1: 0; Pricing 1: 360=0,5950, 720=0,5900, 1080=0,5850, 1440=0,5800 (USD); CellSize: Coin20mm; ComponentLink1URL: http://na.industrial.panasonic.com/sites/default/pidsa/files/crseries_datasheets_merged.pdf; ComponentLink1Description: http://na.industrial.panasonic.com/sites/default/pidsa/files/crseries_datasheets_merged.pdf; Supplier Part Number 1: 8079593
footprint CR-2032/HSN
pins: 1 + (power), 2 - (power)

## CRYSTAL _HC49__9C-27.120MAAJ-T
designator X?, comment 9C-27.120MAAJ-T  Frequency: 27.12MHz
CRYSTAL 27.1200MHZ 18PF SMD; Manufacturer: TXC CORPORATION; Frequency Stability: ±30ppm; Operating Mode: Fundamental; Height - Seated (Max): 0.161" (4.10mm); Size / Dimension: 0.449" L x 0.189" W (11.40mm x 4.80mm); Packaging: Tape & Reel (TR); Manufacturer Part Number: 9C-27.120MAAJ-T; Type: MHz Crystal; Load Capacitance: 18pF; Part Status: Active; Supplier: Digi-Key; Category: Crystals, Oscillators, Resonators; RoHS: RoHS Compliant; Frequency Tolerance: ±30ppm; Operating Temperature: -20°C ~ 70°C; Mounting Type: Surface Mount; Ratings: -; Package / Case: HC-49S; ComponentLink1URL: http://www.txccorp.com/download/products/quartz_crystals/2015TXC_9C_32.pdf; ComponentLink1Description: http://www.txccorp.com/download/products/quartz_crystals/2015TXC_9C_32.pdf; Pricing: 1000=0.192, 3000=0.18, 5000=0.174, 10000=0.168 (USD); Supplier Part Number: 887-2446-2-ND
footprint HC49_SMD_B
pins: 1 OSC1, 2 OSC2

## CRYSTAL__7M-16.000MAAJ-T
designator X?, comment 7M-16.000MAAJ-T
Crystal 16MHz ±30ppm (Tol) ±30ppm (Stability) 18pF FUND 100Ohm 4-Pin SMD T/R; Manufacturer: TXC; ESR (Equivalent Series Resistance): 100R; Supplier 1: Digi-Key; Manufacturer Part Number: 7M-16.000MAAJ-T; RoHS: Yes; Category: Crystals; Pricing 1: 1=0,91000, 10=0,80500, 50=0,75240, 100=0,66500, 500=0,63000, 1000=0,52500 (USD); Mount: Surface Mount; Case/Package: SMD/SMT; Number of Pins: 4; Min Operating Temperature: -10°C; Max Operating Temperature: 70°C; Frequency: 16MHz; Frequency Tolerance: 30ppm; Load Capacitance: 18pF; Package Quantity: 3000; Tolerance: 30ppm; Packaging: Tape and Reel; Frequency Stability: 30ppm; Termination: SMD/SMT; Series: 7M; Length: 3.2mm; Width: 2.5mm; Height: 0.031inch; Depth: 2.5mm; REACH SVHC: No SVHC; RoHS Compliant: Yes; ComponentLink1URL: https://datasheet.ciiva.com/22698/1796637-22698757.pdf?src-supplier=Element14; ComponentLink1Description: https://datasheet.ciiva.com/22698/1796637-22698757.pdf?src-supplier=Element14; ComponentLink2URL: https://datasheet.ciiva.com/46431/1796637-46431980.pdf?src-supplier=Element14; ComponentLink2Description: https://datasheet.ciiva.com/46431/1796637-46431980.pdf?src-supplier=Element14; ComponentLink3URL: https://datasheet.ciiva.com/1356/number-crystal-basic-1356577.pdf?src-supplier=Element14; ComponentLink3Description: https://datasheet.ciiva.com/1356/number-crystal-basic-1356577.pdf?src-supplier=Element14; ComponentLink4URL: https://datasheet.ciiva.com/855/7m-855384.pdf?src-supplier=Digi-Key; ComponentLink4Description: https://datasheet.ciiva.com/855/7m-855384.pdf?src-supplier=Digi-Key; ComponentLink5URL: https://datasheet.ciiva.com/855/7m-855385.pdf?src-supplier=Digi-Key; ComponentLink5Description: https://datasheet.ciiva.com/855/7m-855385.pdf?src-supplier=Digi-Key; ComponentLink6URL: https://datasheet.ciiva.com/855/7m-855386.pdf?src-supplier=Digi-Key; ComponentLink6Description: https://datasheet.ciiva.com/855/7m-855386.pdf?src-supplier=Digi-Key; Supplier Part Number 1: 887-1125-6-ND
footprint XTAL_3.2mm_2.5mm_4pad
pins: 1 OSC1, 2 GND (power), 3  OSC2, 4 GND (power)

## CRYSTAL__ABS07AIG-32.768KHZ-9-1-T
designator X?, comment ABS07AIG-32.768KHZ-9-1-T  Frequency: 32.768kHz
CRYSTAL 32.768KHZ 9PF SMD; Manufacturer: Abracon LLC; Operating Mode: Fundamental; Frequency Tolerance: ±10ppm; Load Capacitance: 9pF; Ratings: AEC-Q200; Size / Dimension: 0.126" L x 0.059" W (3.20mm x 1.50mm); Height - Seated (Max): 0.035" (0.90mm); RoHS: RoHS Compliant; Category: Crystals, Oscillators, Resonators; Manufacturer Part Number: ABS07AIG-32.768KHZ-9-1-T; Packaging: Tape & Reel (TR); Type: kHz Crystal (Tuning Fork); Mounting Type: Surface Mount; Part Status: Active; Operating Temperature: -40°C ~ 125°C; Package / Case: 2-SMD, No Lead; Frequency Stability: -; Supplier: Digi-Key; ComponentLink1URL: http://www.abracon.com/AIGcrystals/ABS07AIG.pdf; ComponentLink1Description: http://www.abracon.com/AIGcrystals/ABS07AIG.pdf; Pricing: 3000=0.609, 6000=0.588, 15000=0.567 (USD); Supplier Part Number: 535-13353-2-ND
footprint XTAL_3.2mm_1.5mm_2pad
pins: 1 OSC1, 2  OSC2

## CRYSTAL__ECS-260-18-5PLX-AGN-TR
designator X?, comment ECS-260-18-5PLX-AGN-TR  Frequency: 26MHz
CRYSTAL 26.000MHZ 18PF SMT; Manufacturer: ECS International; Supplier 1: Digi-Key; Manufacturer Part Number: ECS-260-18-5PLX-AGN-TR; Stock 1: 1922; Pricing 1: 1=0.37, 10=0.308, 50=0.2772, 100=0.2464, 500=0.2341 (USD); ComponentLink1URL: https://www.ecsxtal.com/store/pdf/csm-7x.pdf?src-supplier=Digi-Key; ComponentLink1Description: https://www.ecsxtal.com/store/pdf/csm-7x.pdf?src-supplier=Digi-Key; Supplier Part Number 1: XC2796CT-ND
footprint HC49_SMD_A
pins: 1 OSC1, 2  OSC2